# Altium footprint library mastermind.PCBLIB: 1061 footprints (part 24 of 67)
Each footprint in its own frame and in the unit in brackets; x right, y up, seen from the top. Pads: shape width x height; smd on the part's side, far side on the other; paste and mask are expansions set on the pad; w line width, h text height; cw(c..) or ccw(c..) is an arc to the next point about the centre after c.
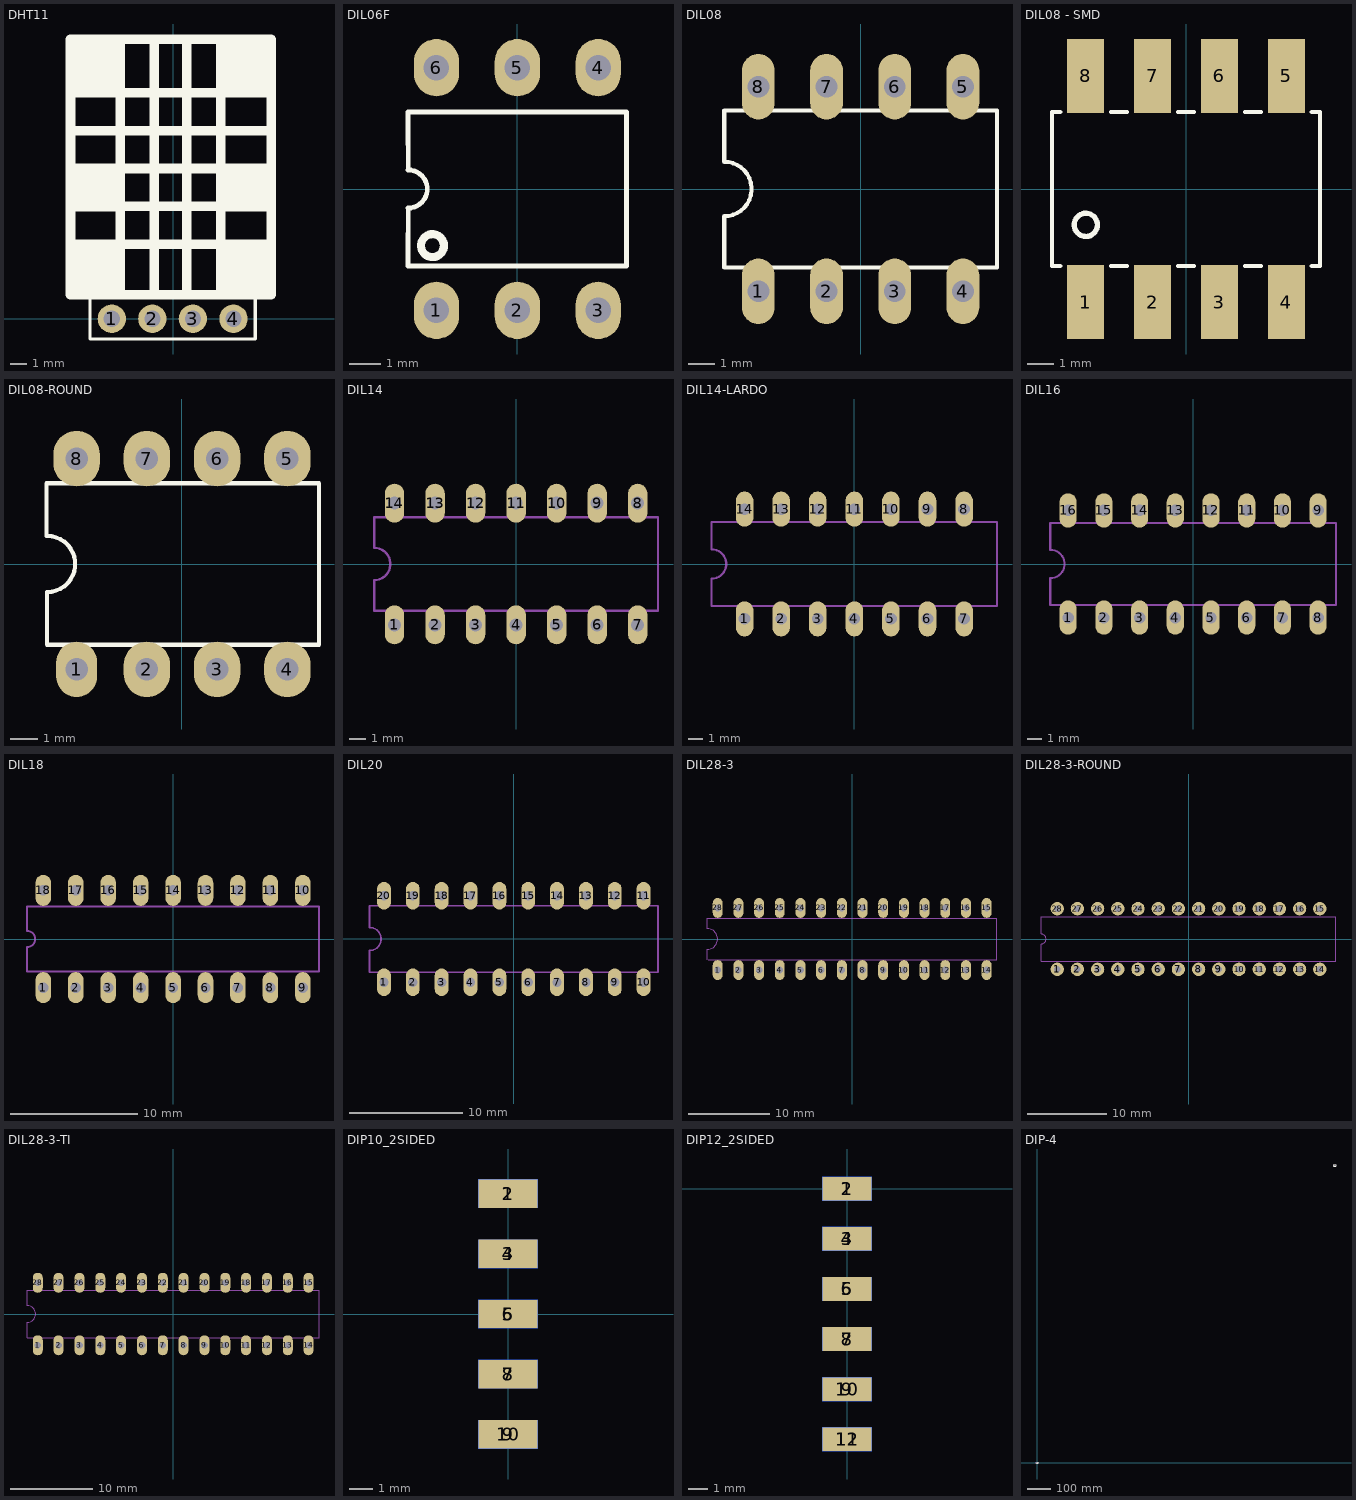
[diagram p23: the footprints below, top view; thin cyan lines are the x and y axes]

## DHT11 [mil]
pads (4):
  round 70 hole 40: 1(-152,0) 2(-52,0) 3(48,0) 4(148,0)
Top Overlay:
  rectangle: 118,555 241,690
  rectangle: -255,554 -132,690
  rectangle: -253,265 -130,372
  rectangle: 117,265 240,368
  rectangle: 120,67 233,182
  rectangle: -263,65 -140,179
  lines w7.87: -206,49 -206,-50 202,-50 202,76
  lines w23.62: -255.06,277.25 241,277.25 ; -252,370.5 241,370.5 ; -252,463.75 241,463.75 ; -249,184 239,184 ; -241,557 232,557 ; -131,61 -131,686 ; -47,62 -47,687 ; 33,64 33,689 ; 117,61 117,686 ; 241,61 241,689 -254,689 -254,59 241.06,59
Mechanical 8:
  region: 140,-10 140,10 160,10 160,-10
  region: 40,-10 40,10 60,10 60,-10
  region: -60,-10 -60,10 -40,10 -40,-10
  region: -160,-10 -160,10 -140,10 -140,-10

## DIL06F [mm]
pads (6):
  oval 1.422x1.8 hole 0.8: 1(-2.54,-3.81) 2(0,-3.81) 3(2.54,-3.81) 4(2.54,3.81) 5(0,3.81) 6(-2.54,3.81)
Top Overlay:
  circle w0.254: c-2.667,-1.778 r0.359
  lines w0.152: -3.429,-2.413 3.429,-2.413 3.429,2.413 -3.429,2.413 -3.429,1.397 -3.429,0.6 cw(c-3.429,0) -3.429,-0.6 -3.429,-1.397 -3.429,-2.413
3D body "User Library-DIP6.STEP": height 5.3, standoff -2, extent -3.56,-4.06 3.56,3.81

## DIL08 [mil]
pads (8):
  oval 48x96 hole 32: 1(-150,-150) 2(-50,-150) 3(50,-150) 4(150,-150) 5(150,150) 6(50,150) 7(-50,150) 8(-150,150)
Top Overlay:
  lines w6: -200,-115 200,-115 200,115 -200,115 -200,40 cw(c-200,0) -200,-40 -200,-115

## DIL08 - SMD [mm]
pads (8):
  rect 1.4x2.8 smd: 1(-3.81,-4.29) 2(-1.27,-4.29) 3(1.27,-4.29) 4(3.81,-4.29) 5(3.81,4.29) 6(1.27,4.29) 7(-1.27,4.29) 8(-3.81,4.29)
Top Overlay:
  circle w0.2: c-3.8,-1.36 r0.44
  lines w0.152: -4.77,-2.921 -5.08,-2.921 -5.08,-1.016 -5.08,2.921 -4.77,2.921 ; -2.85,-2.921 -2.23,-2.921 ; -2.85,2.921 -2.23,2.921 ; -0.31,-2.921 0.31,-2.921 ; -0.31,2.921 0.31,2.921 ; 2.23,-2.921 2.85,-2.921 ; 2.23,2.921 2.85,2.921 ; 4.77,-2.921 5.08,-2.921 5.08,2.921 4.77,2.921
3D body "SMD DIP 8 (op7) vishay.STEP": height 4.25, standoff 0, extent -4.875,-5.025 4.875,5.025

## DIL08-ROUND [mil]
pads (8):
  oval 58x78.74 hole 32: 1(-150,-150)
  oval 66x78.74 hole 32: 2(-50,-150) 3(50,-150) 4(150,-150) 5(150,150) 6(50,150) 7(-50,150) 8(-150,150)
Top Overlay:
  lines w6: -193,40 -193,115 195,115 195,-115 -192,-115 -192,-40 ccw(c-192,0) -192,40
3D body "CircuitWorks-DIL 8 MINIDIP IC.step": height 188.98, standoff -129.92, extent -191.92,-154.92 193.91,154.93

## DIL14 [mil]
pads (14):
  oval 48x96 hole 32: 1(-300,-150) 2(-200,-150) 3(-100,-150) 4(0,-150) 5(100,-150) 6(200,-150) 7(300,-150) 8(300,150) 9(200,150) 10(100,150) 11(0,150) 12(-100,150) 13(-200,150) 14(-300,150)
Mechanical 2:
  lines w6: -350,-115 350,-115 350,115 -350,115 -350,40 cw(c-350,0) -350,-40 -350,-115

## DIL14-LARDO [mil]
pads (14):
  oval 48x96 hole 32: 1(-300,-150) 2(-200,-150) 3(-100,-150) 4(0,-150) 5(100,-150) 6(200,-150) 7(300,-150) 8(300,150) 9(200,150) 10(100,150) 11(0,150) 12(-100,150) 13(-200,150) 14(-300,150)
Mechanical 2:
  lines w6: -390,-115 -390,-40 ccw(c-390,0) -390,40 -390,115 390,115 390,-115 -390,-115

## DIL16 [mil]
pads (16):
  oval 48x96 hole 32: 1(-350,-150) 2(-250,-150) 3(-150,-150) 4(-50,-150) 5(50,-150) 6(150,-150) 7(250,-150) 8(350,-150) 9(350,150) 10(250,150) 11(150,150) 12(50,150) 13(-50,150) 14(-150,150) 15(-250,150) 16(-350,150)
Mechanical 2:
  lines w6: -400,-115 -400,-40 ccw(c-400,0) -400,40 -400,115 400,115 400,-115 -400,-115

## DIL18 [mil]
pads (18):
  oval 48x96 hole 32: 1(-400,-150) 2(-300,-150) 3(-200,-150) 4(-100,-150) 5(0,-150) 6(100,-150) 7(200,-150) 8(300,-150) 9(400,-150) 10(400,150) 11(300,150) 12(200,150) 13(100,150) 14(0,150) 15(-100,150) 16(-200,150) 17(-300,150) 18(-400,150)
Mechanical 2:
  lines w6: -450,-100 450,-100 450,100 -450,100 -450,25 cw(c-450,0) -450,-25 -450,-100

## DIL20 [mil]
pads (20):
  oval 48x96 hole 32: 1(-450,-150) 2(-350,-150) 3(-250,-150) 4(-150,-150) 5(-50,-150) 6(50,-150) 7(150,-150) 8(250,-150) 9(350,-150) 10(450,-150) 11(450,150) 12(350,150) 13(250,150) 14(150,150) 15(50,150) 16(-50,150) 17(-150,150) 18(-250,150) 19(-350,150) 20(-450,150)
Mechanical 2:
  lines w6: -500,-115 -500,-40 ccw(c-500,0) -500,40 -500,115 500,115 500,-115 -500,-115

## DIL28-3 [mil]
pads (28):
  oval 48x96 hole 32: 1(-650,-150) 2(-550,-150) 3(-450,-150) 4(-350,-150) 5(-250,-150) 6(-150,-150) 7(-50,-150) 8(50,-150) 9(150,-150) 10(250,-150) 11(350,-150) 12(450,-150) 13(550,-150) 14(650,-150) 15(650,150) 16(550,150) 17(450,150) 18(350,150) 19(250,150) 20(150,150) 21(50,150) 22(-50,150) 23(-150,150) 24(-250,150) 25(-350,150) 26(-450,150) 27(-550,150) 28(-650,150)
Mechanical 2:
  lines w6: -700,-100 -700,-50 ccw(c-700,0) -700,50 -700,100 700,100 700,-100 -695,-100

## DIL28-3-ROUND [mil]
pads (28):
  round 66 hole 32: 1(-650,-150) 2(-550,-150) 3(-450,-150) 4(-350,-150) 5(-250,-150) 6(-150,-150) 7(-50,-150) 8(50,-150) 9(150,-150) 10(250,-150) 11(350,-150) 12(450,-150) 13(550,-150) 14(650,-150) 15(650,150) 16(550,150) 17(450,150) 18(350,150) 19(250,150) 20(150,150) 21(50,150) 22(-50,150) 23(-150,150) 24(-250,150) 25(-350,150) 26(-450,150) 27(-550,150) 28(-650,150)
Mechanical 2:
  lines w6: -730,-110 730,-110 730,110 -730,110 -730,25 cw(c-730,0) -730,-25 -730,-110

## DIL28-3-TI [mil]
pads (28):
  oval 48x96 hole 32: 1(-650,-150) 2(-550,-150) 3(-450,-150) 4(-350,-150) 5(-250,-150) 6(-150,-150) 7(-50,-150) 8(50,-150) 9(150,-150) 10(250,-150) 11(350,-150) 12(450,-150) 13(550,-150) 14(650,-150) 15(650,150) 16(550,150) 17(450,150) 18(350,150) 19(250,150) 20(150,150) 21(50,150) 22(-50,150) 23(-150,150) 24(-250,150) 25(-350,150) 26(-450,150) 27(-550,150) 28(-650,150)
Mechanical 2:
  lines w6: -700,-115 -700,-40 ccw(c-700,0) -700,40 -700,115 700,115 700,-115 -700,-115

## DIP10_2SIDED [mm]
pads (10):
  rect 2.5x1.2 smd: 1(0,5.08) 3(0,2.54) 5(0,0) 7(0,-2.54) 9(0,-5.08)
  rect 2.5x1.2 smd far side: 2(0,5.08) 4(0,2.54) 6(0,0) 8(0,-2.54) 10(0,-5.08)
3D body "TSM-105-02-S-SH-K.STEP": height 2.85, standoff -0.2, extent -1.446,-6.41 14.048,6.29
3D body "TSM-105-02-S-SH-K.STEP": height -0.2, standoff -3.25, extent -1.446,-6.43 14.048,6.27

## DIP12_2SIDED [mm]
pads (12):
  rect 2.5x1.2 smd: 1(0,0) 3(0,-2.54) 5(0,-5.08) 7(0,-7.62) 9(0,-10.16) 11(0,-12.7)
  rect 2.5x1.2 smd far side: 2(0,0) 4(0,-2.54) 6(0,-5.08) 8(0,-7.62) 10(0,-10.16) 12(0,-12.7)

## DIP-4 [mm]
pads (8):
  rect 1.26x1.26 hole 0.84: 1(-3.678,1.165)
  round 1.5 hole 1: 1(1272.899,1270.355) 2(1272.899,1267.815) 3(1267.399,1267.815) 4(1267.399,1270.355)
  round 1.26 hole 0.84: 2(-3.678,-1.375) 3(3.942,-1.375) 4(3.942,1.165)
Top Overlay:
  circle w0.2: c-4.778,1.165 r0.1
  lines w0.127: -3.118,-2.405 3.382,-2.405 ; -3.118,2.195 3.382,2.195
  lines w0.152: 1264.999,1266.135 1274.172,1266.135 1275.299,1267.262 1275.299,1270.92 1274.184,1272.035 1264.999,1272.035 1264.999,1266.135
Mechanical 13:
  circle w0.2: c-4.778,1.165 r0.1
  lines w0.127: -3.118,-2.405 -3.118,2.195 3.382,2.195 3.382,-2.405 -3.118,-2.405
Mechanical 15:
  lines w0.05: -4.568,-2.655 -4.568,2.445 4.832,2.445 4.832,-2.655 -4.568,-2.655